# Altium footprint library PCB_Footprints.PcbLib: 303 footprints (part 16 of 19)
Each footprint in its own frame and in the unit in brackets; x right, y up, seen from the top. Pads: shape width x height; smd on the part's side, far side on the other; paste and mask are expansions set on the pad; w line width, h text height; cw(c..) or ccw(c..) is an arc to the next point about the centre after c.
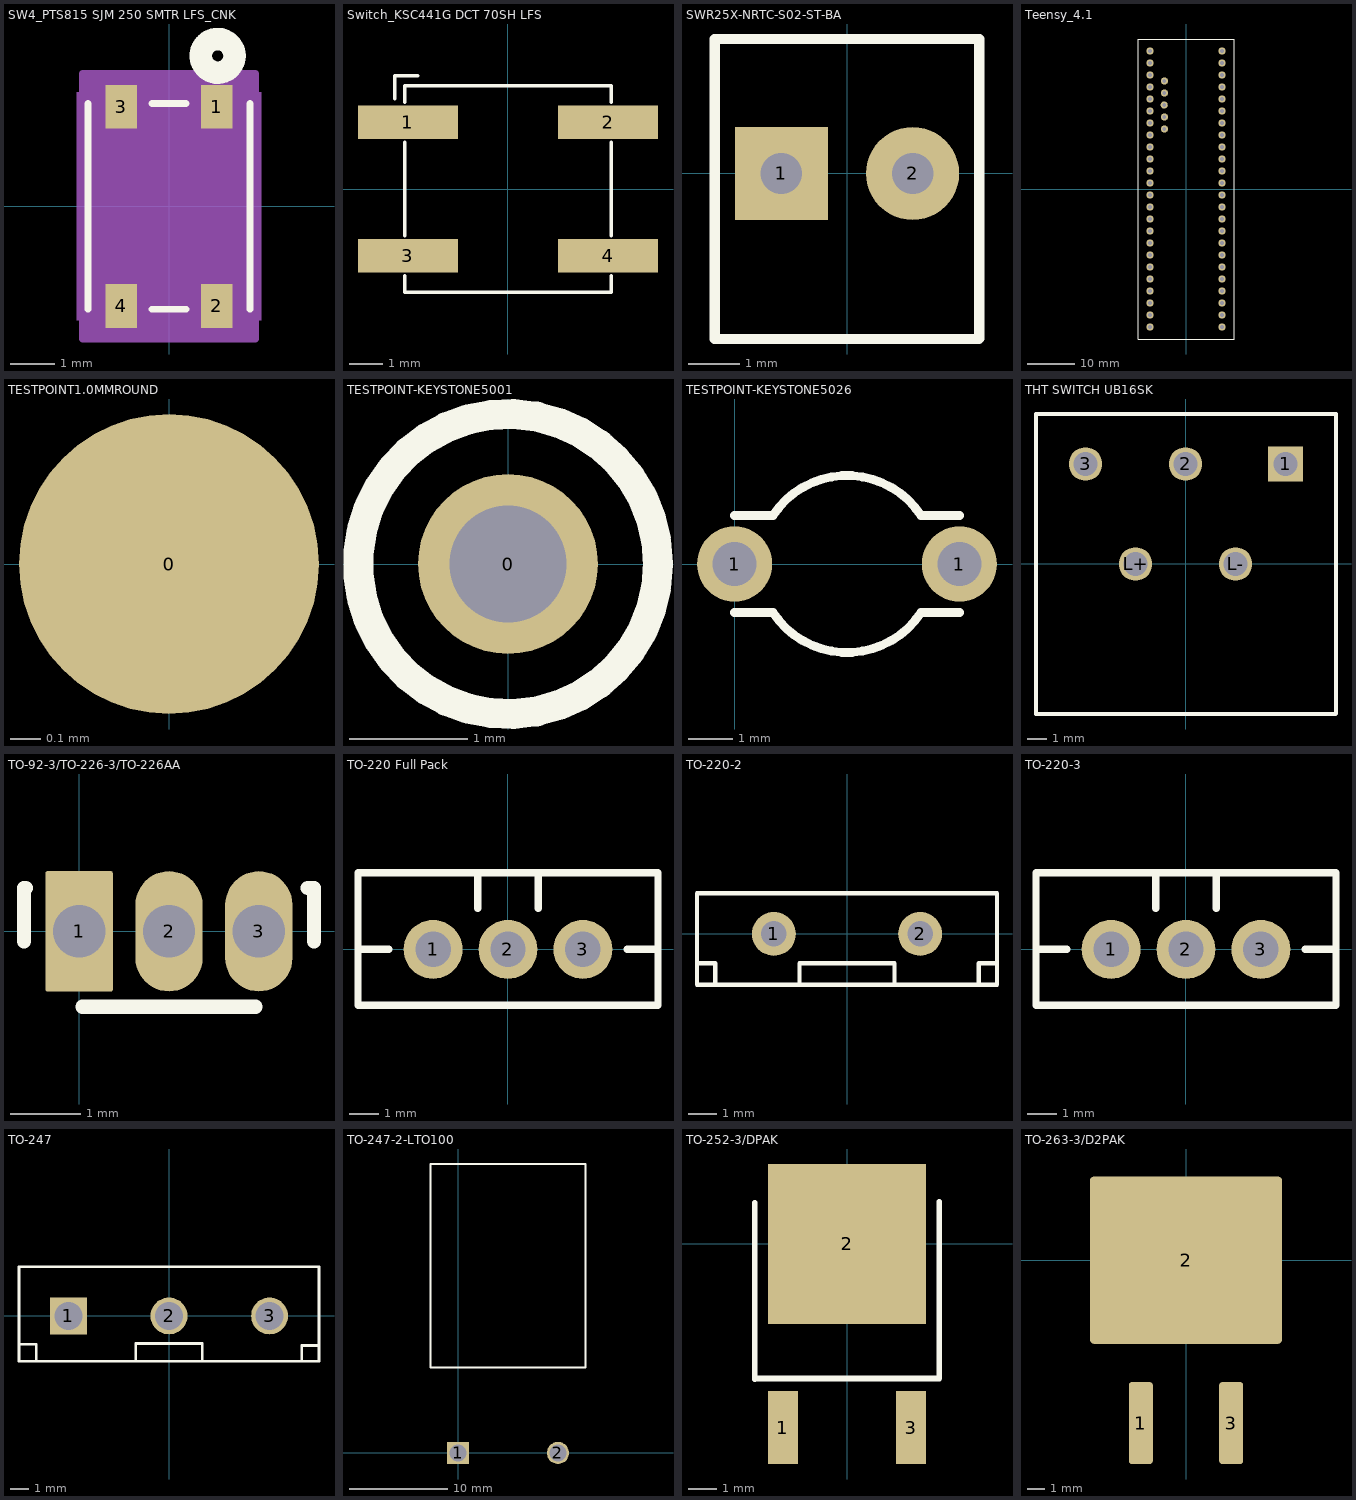
[diagram p15: the footprints below, top view; thin cyan lines are the x and y axes]

## SW4_PTS815 SJM 250 SMTR LFS_CNK [mm]
pads (4):
  rect 0.711x0.991 smd paste+0 mask+0: 1(1.075,2.25) 2(1.075,-2.25) 3(-1.075,2.25) 4(-1.075,-2.25)
Top Overlay:
  circle w0.508: c1.1,3.4 r0.381
  lines w0.152: -1.829,-2.324 -1.829,2.324 ; -0.387,-2.324 0.387,-2.324 ; -0.387,2.324 0.387,2.324 ; 1.829,-2.324 1.829,2.324
Bottom 3D Body (Mech5):
  region: 2.083,2.578 2.083,-2.578 -2.083,-2.578 -2.083,2.578
Mechanical 13:
  lines w0.025: -1.702,-2.197 1.702,-2.197 1.702,2.197 -1.702,2.197 -1.702,-2.197
Mechanical 15:
  region: 1.956,-2.999 1.956,2.999 -1.956,2.999 -1.956,-2.999
  lines w0.152: -1.956,-2.999 1.956,-2.999 1.956,2.999 -1.956,2.999 -1.956,-2.999
3D body: height 2, standoff 0, extent -1.825,-2.324 1.825,2.325
3D body: height 0.51, standoff 0, extent -1.2,-1.2 1.2,1.2
3D body: height 3, standoff 0, extent -1.2,-1.2 1.2,1.2

## Switch_KSC441G DCT 70SH LFS [mm]
pads (4):
  rect 3x1 smd: 1(-3,2) 2(3,2) 3(-3,-2) 4(3,-2)
Top Overlay:
  lines w0.1: -3.4,2.7 -3.4,3.4 -3.1,3.4 ; -3.1,-2.6 -3.1,-3.1 0,-3.1 3.1,-3.1 3.1,-2.6 ; -3.1,-1.4 -3.1,1.4 ; -3.1,2.6 -3.1,3.1 0,3.1 3.1,3.1 3.1,2.6 ; 3.1,-1.4 3.1,1.4 ; -3.1,3.4 -2.7,3.4 -3.1,3.4
3D body: height 2.9, standoff 0, extent -3.1,-3.1 3.1,3.1
3D body: height 5.2, standoff 0, extent -1.35,-1.35 1.35,1.35

## SWR25X-NRTC-S02-ST-BA [mm] "Connector; Header; 2 Position"
pads (2):
  rect 1.8x1.8 hole 0.8: 1(-1.27,0)
  round 1.8 hole 0.8: 2(1.27,0)
Top Overlay:
  lines w0.2: -2.56,-3.2 -2.56,2.6 2.56,2.6 2.56,-3.19 2.55,-3.2 -2.55,-3.2

## Teensy_4.1 [mil]
pads (53):
  round 60 hole 30: 1(-300,1150) 2(-300,1050) 3(-300,950) 4(-300,850) 5(-300,750) 6(-300,650) 7(-300,550) 8(-300,450) 9(-300,350) 10(-300,250) 11(-300,150) 12(-300,50) 13(-300,-50) 14(-300,-150) 15(-300,-250) 16(-300,-350) 17(-300,-450) 18(-300,-550) 19(-300,-650) 20(-300,-750) 21(-300,-850) 22(-300,-950) 23(-300,-1050) 24(-300,-1150) 25(300,-1150) 26(300,-1050) 27(300,-950) 28(300,-850) 29(300,-750) 30(300,-650) 31(300,-550) 32(300,-450) 33(300,-350) 34(300,-250) 35(300,-150) 36(300,-50) 37(300,50) 38(300,150) 39(300,250) 40(300,350) 41(300,450) 42(300,550) 43(300,650) 44(300,750) 45(300,850) 46(300,950) 47(300,1050) 48(300,1150) 49(-179.92,900) 50(-179.92,800) 51(-181.89,700) 52(-179.92,600) 53(-179.92,500)
Top Overlay:
  lines w10: -400,-1250 400,-1250 400,1250 -400,1250 -400,-1250
3D body "Teensy_4.1.STEP": height 594.84, standoff 387.44, extent -350,-1361.42 350,1259.06

## TESTPOINT1.0MMROUND [mm] "TestPoint 1mm Round"
pads (1):
  round 1 smd paste-1: 0(0,0)

## TESTPOINT-KEYSTONE5001 [mil] "Through-hole test point"
pads (1):
  round 60 hole 39: 0(0,0)
Top Overlay:
  circle w10: c0,0 r50
3D body "keystone-PN5001.STEP": height 180, standoff -120, extent -49.99,-49.99 50.01,50.01

## TESTPOINT-KEYSTONE5026 [mm] "From Keystone 5026 datasheet"
pads (2):
  round 1.7 hole 1: 1(0,0) 1(5.08,0)
Top Overlay:
  lines w0.2: 0,-1.1 0.87,-1.1 ccw(c2.54,0) 4.21,-1.1 5.08,-1.1 ; 0,1.1 0.87,1.1 cw(c2.54,0) 4.21,1.1 5.08,1.1
3D body "keystone-PN5026-mod.STEP": height 7.94, standoff -2.01, extent -0.23,-0.254 5.31,0.254

## THT SWITCH UB16SK [mm] "SURFACE MOUNT SWITCH-UB16SKG035F-FF and UB15SKG035F-FF, SPDP swtiches 5 pins."
height 2.7
pads (5):
  rect 1.8x1.8 hole 1.2: 1(5.08,5.08)
  round 1.7 hole 1.2: 2(0,5.08) 3(-5.08,5.08) L+(-2.54,0) L-(2.54,0)
Top Overlay:
  lines w0.2: 7.62,-7.62 -7.595,-7.62 -7.595,7.62 7.645,7.62 7.645,-7.595
3D body "UB16SKW035F-FF.stp": height 12.51, standoff -3.98, extent -7.62,-7.645 7.62,7.595

## TO-92-3/TO-226-3/TO-226AA [mm] "Trough Hole, 3.25H x 4.1W x 1.62T. DRV5055-Q1 Datasheet 03/2020. Modified for more pad clearance"
height 5.05
pads (3):
  rrect5% 0.95x1.7 hole 0.74: 1(0,0)
  oval 0.95x1.7 hole 0.74: 2(1.27,0) 3(2.54,0)
Top Overlay:
  lines w0.2: -0.78,-0.139 -0.78,0.611 -0.755,0.611 ; 0.05,-1.066 1.046,-1.066 1.494,-1.066 2.49,-1.066 ; 3.231,0.613 3.32,0.611 3.32,-0.139
3D body "CircuitWorks-HALL SENSOR DIP.STEP": height 4.65, standoff -2, extent -0.78,-0.889 3.32,0.611

## TO-220 Full Pack [mm] "TO-220 Full Pack. Dimensions from ST DocID022921 rev 2"
height 16.4
pads (3):
  round 2 hole 1.2: 1(-2.54,0) 2(0,0) 3(2.54,0)
Top Overlay:
  lines w0.254: -5.025,0 -4.05,0 ; -1.025,1.4 -1.025,2.575 ; 1.025,1.4 1.025,2.575 ; 4.05,0 5.025,0 ; -5.09,-1.9 5.09,-1.9 5.09,2.6 -5.09,2.6 -5.09,-1.9
3D body "User Library-TO-220FP.step": height 19.4, standoff -10.2, extent -5.09,-1.5 5.09,3

## TO-220-2 [mil] "PWR221T-30 Series Power Resistor"
pads (2):
  round 60 hole 35: 1(-100,0) 2(100,0)
Top Overlay:
  lines w5.91: -205,-40 -180,-40 -180,-69.5 ; -65,-69.5 -65,-40 65,-40 65,-69.5 ; 180,-69.5 180,-40 205,-40 ; -205,-69.5 205,-69.5 205,55.5 -205,55.5 -205,-69.5
3D body: height 100, standoff 0, extent 85.51,-14.48 114.51,14.5
3D body: height 100, standoff 0, extent -114.49,-14.48 -85.49,14.49
3D body "User Library-TO 220-2.step": height 724.12, standoff -393.2, extent -189.99,-88.58 190.01,88.59

## TO-220-3 [mm] "TO-220-3. Dimensions from ST DocID022921 rev 2"
height 16.4
pads (3):
  round 2 hole 1.2: 1(-2.54,0) 2(0,0) 3(2.54,0)
Top Overlay:
  lines w0.254: -5.025,0 -4.05,0 ; -1.025,1.4 -1.025,2.575 ; 1.025,1.4 1.025,2.575 ; 4.05,0 5.025,0 ; -5.09,-1.9 5.09,-1.9 5.09,2.6 -5.09,2.6 -5.09,-1.9
3D body "User Library-TO220AB.step": height 23.33, standoff -6, extent -5.606,-1.495 5.607,3.195

## TO-247 [mm] "TO-247. Made to IXTH15N50L2"
height 25.96
pads (3):
  rect 2x2 hole 1.5: 1(-5.45,0)
  round 2 hole 1.5: 2(0,0) 3(5.45,0)
Top Overlay:
  lines w0.15: -8.06,-1.53 -7.2,-1.53 -7.2,-2.46 ; -1.8,-2.46 -1.8,-1.5 1.8,-1.5 1.8,-2.46 ; 7.2,-2.46 7.2,-1.6 8.13,-1.6 ; -8.13,-2.46 -8.13,2.67 8.13,2.67 8.13,-2.46 -8.13,-2.46
3D body "User Library-TO247.STEP": height 26.16, standoff -15.75, extent -8.23,-2.6 8.03,2.7

## TO-247-2-LTO100 [mm] "TO-247 2 bent leads for vishay LTO 100 resistors"
height 5
pads (2):
  rect 2.25x2.25 hole 1.75: 1(0,0)
  round 2.25 hole 1.75: 2(10.16,0)
Top Overlay:
  pour cut-out: 4.33,26.25 6.58,26.25
  lines w0.2: 5.08,29.37 12.96,29.37 ; 12.96,29.37 -2.8,29.37 -2.8,8.67 12.96,8.67 12.96,29.37
3D body: height 3, standoff -3.1, extent -0.75,-0.3 0.75,0.3
3D body: height 3, standoff -3.1, extent 9.41,-0.3 10.91,0.3
3D body: height 3, standoff 2.4, extent 8.36,-0.3 11.96,8.7
3D body: height 3, standoff 2.4, extent -1.8,-0.3 1.8,8.7
3D body: height 5, standoff 0, extent -2.8,8.67 12.96,29.37

## TO-252-3/DPAK [mm] "TO-252-3, DPak (2 Leads + Tab), SC-63"
pads (3):
  rect 1.06x2.6 smd: 1(-2.286,-6.55) 3(2.286,-6.55)
  rect 5.632x5.7 smd: 2(0,0)
Top Overlay:
  lines w0.2: -3.29,-4.825 -3.29,1.475 ; -3.29,-4.8 3.29,-4.8 3.29,1.5
3D body "User Library-TO252AA.step": height 2.3, standoff -0.01, extent -3.29,-7.225 3.29,2.475

## TO-263-3/D2PAK [mm] "TO-263-3, D²Pak (2 Leads + Tab), TO-263AA. From Infineon Website"
height 4.83
pads (3):
  rrect25% 1.35x4.6 smd: 1(-2.54,-9.15) 3(2.54,-9.15)
  rrect5% 10.8x9.4 smd paste-99: 2(0,0)
Top Paste:
  region: 0.15,-0.15 0.15,-4.65 5.35,-4.65 5.35,-0.15
  region: -5.35,-0.15 -5.35,-4.65 -0.15,-4.65 -0.15,-0.15
  region: -0.15,0.15 -0.15,4.65 -5.35,4.65 -5.35,0.15
  region: 5.35,0.15 5.35,4.65 0.15,4.65 0.15,0.15
3D body "User Library-TO263-3S.STEP": height 4.78, standoff -0.02, extent -5,-11.125 5,4.545